# Altium footprint library 3.Inductors&Transformers.PcbLib: 51 footprints (part 3 of 4)
Each footprint in its own frame and in the unit in brackets; x right, y up, seen from the top. Pads: shape width x height; smd on the part's side, far side on the other; paste and mask are expansions set on the pad; w line width, h text height; cw(c..) or ccw(c..) is an arc to the next point about the centre after c.
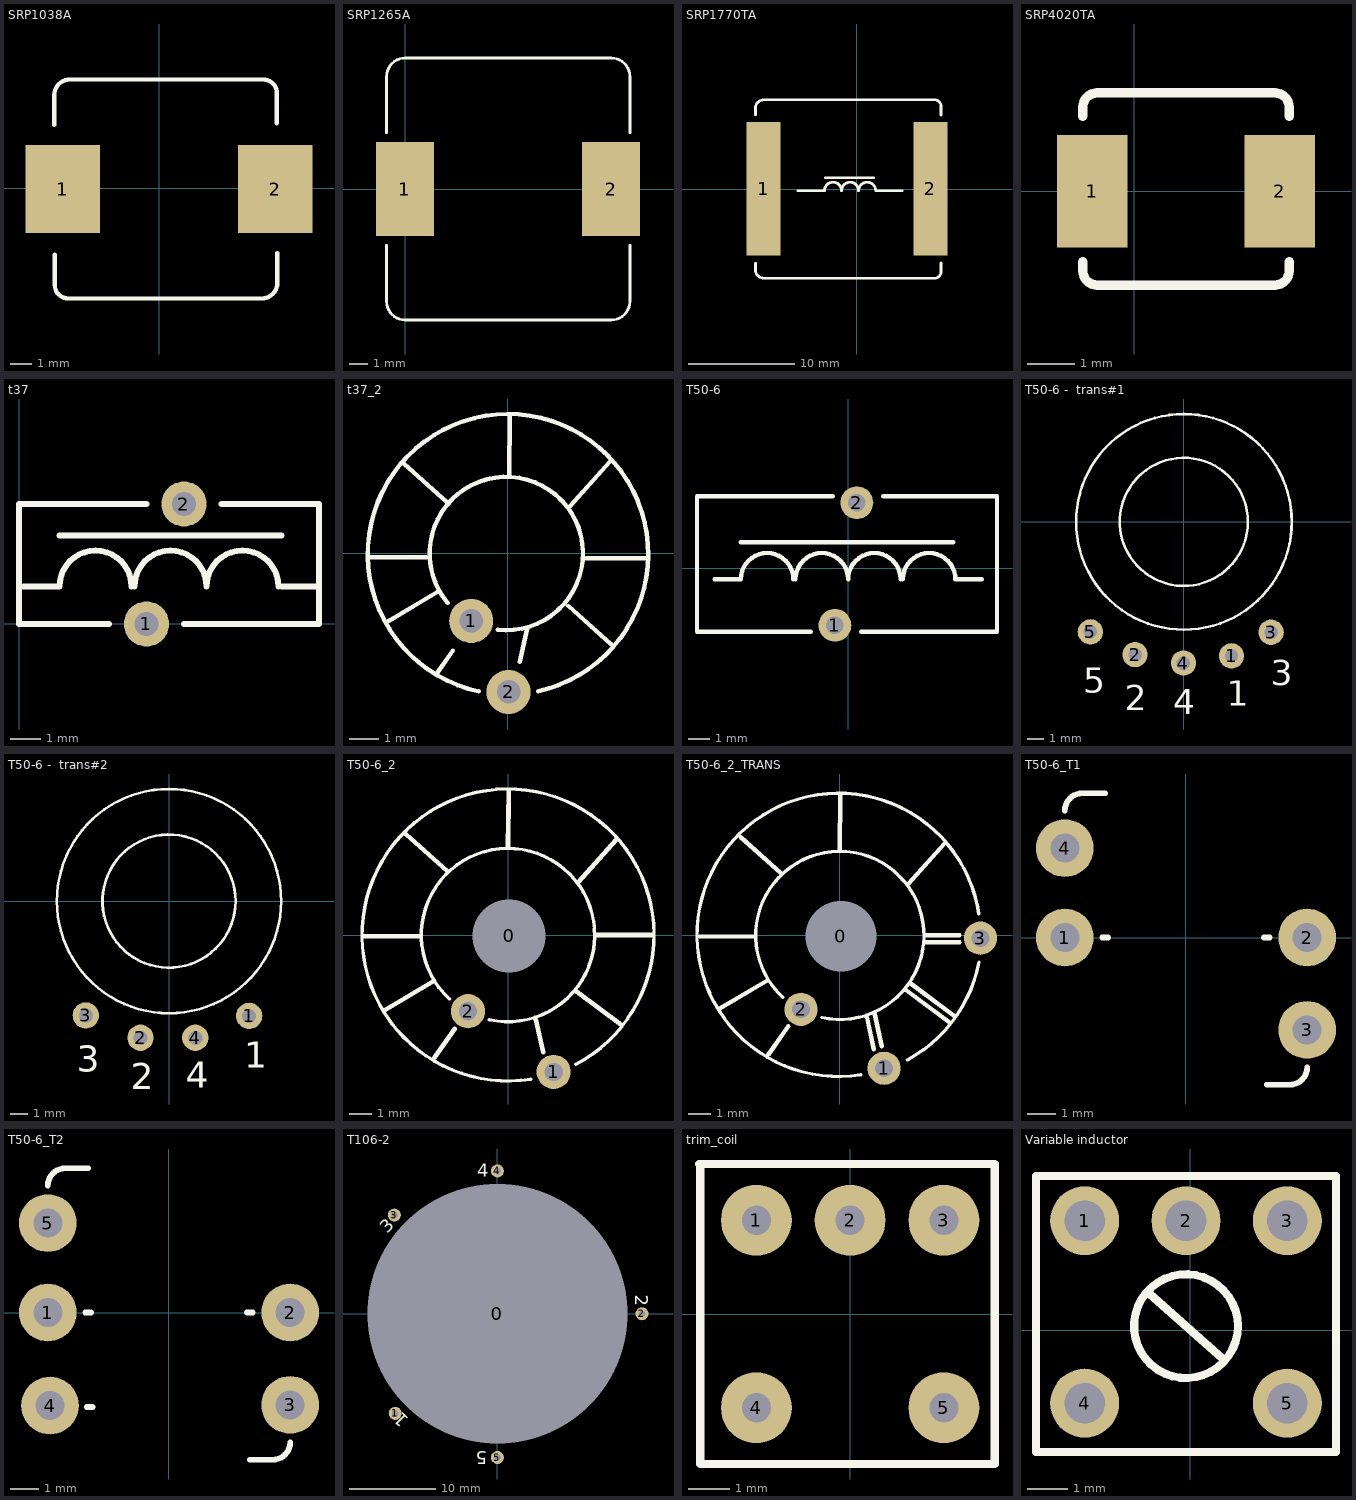
[diagram p2: the footprints below, top view; thin cyan lines are the x and y axes]

## SRP1038A [mm]
pads (2):
  rect 3.5x4.1 smd: 1(-4.525,-0.025) 2(5.425,-0.025)
Top Overlay:
  lines w0.2: -4.925,2.975 -4.925,4.35 ; -4.925,4.25 -4.925,4.375 cw(c-4.2,4.375) -4.2,5.1 ; -4.9,-4.525 ccw(c-4.275,-4.525) -4.275,-5.15 4.75,-5.15 ; -4.9,-4.475 -4.9,-3.1 ; -4.15,5.1 4.875,5.1 cw(c4.875,4.475) 5.5,4.475 ; 4.8,-5.15 ccw(c4.8,-4.425) 5.525,-4.425 5.525,-4.3 ; 5.5,3.05 5.5,4.425 ; 5.525,-4.4 5.525,-3.025
3D body "User Library-SRP 1038A.step": height 4, standoff 0, extent -4.925,-4.925 5.475,5.075

## SRP1265A [mm]
pads (2):
  rect 3.1x5 smd: 1(-0.025,0) 2(11,0)
Top Overlay:
  lines w0.15: -1,-3 -1,-6 ccw(c0,-6) 0,-7 11,-7 ccw(c11,-6) 12,-6 12,-3 ; -1,3 -1,6 cw(c0,6) 0,7 11,7 cw(c11,6) 12,6 12,3
3D body: height 6.2, standoff 0.2, extent -1,-7 12,7
3D body: height 2, standoff 0, extent 12,-2.5 12.25,2.5
3D body: height 2, standoff 0, extent -1.25,-2.5 -1,2.5

## SRP1770TA [mm]
pads (2):
  rect 3.2x12.5 smd: 1(-8.725,0.05) 2(6.9,0.05)
Top Overlay:
  lines w0.254: -9.5,-6.925 -9.5,-7.526 ccw(c-8.701,-7.526) -8.701,-8.325 7.305,-8.325 ccw(c7.305,-7.73) 7.9,-7.73 7.9,-6.9 ; -9.5,7 -9.5,7.601 cw(c-8.701,7.601) -8.701,8.4 7.305,8.4 cw(c7.305,7.805) 7.9,7.805 7.9,6.975 ; -5.5,-0.125 -3.05,-0.125 ; -3.025,-0.125 cw(c-2.225,-0.125) -1.425,-0.125 cw(c-0.625,-0.125) 0.175,-0.125 cw(c0.975,-0.125) 1.775,-0.125 ; -2.95,1.1 1.6,1.1 ; 1.825,-0.125 4.275,-0.125
3D body "User Library-SRP1770TA.step": height 6.75, standoff 0.05, extent -9.5,-8.475 7.9,8.425

## SRP4020TA [mm]
pads (2):
  rect 1.5x2.4 smd: 1(-0.9,0) 2(3.1,0)
Top Overlay:
  lines w0.2: -1.1,-1.5 -1.1,-1.7 ccw(c-0.8,-1.7) -0.8,-2 3,-2 ccw(c3,-1.7) 3.3,-1.7 3.3,-1.5 ; -1.1,1.6 -1.1,1.8 cw(c-0.8,1.8) -0.8,2.1 3,2.1 cw(c3,1.8) 3.3,1.8 3.3,1.6
3D body "User Library-SRP-4020 Inductor.step": height 2, standoff 0.05, extent -1.05,-1.9 3.25,2.1

## t37 [mm]
pads (2):
  round 1.5 hole 0.8: 1(4.25,0) 2(5.5,4)
Top Overlay:
  lines w0.2: 0.15,1.25 1.35,1.25 cw(c2.55,1.25) 3.75,1.25 ; 1.35,2.95 8.75,2.95 ; 3,0 0,0 0,4 4.25,4 ; 3.85,1.25 cw(c5.05,1.25) 6.25,1.25 cw(c7.45,1.25) 8.65,1.25 ; 5.5,0 10,0 10,4 6.75,4 ; 8.75,1.25 9.95,1.25
3D body "T37-6 IND.STEP": height 10.72, standoff 0, extent -0.25,-2.237 10.259,6.237

## t37_2 [mm]
pads (2):
  round 1.5 hole 0.8: 1(-1.238,-2.295) 2(0.032,-4.708)
Top Overlay:
  lines w0.15: -4.667,-0.136 -2.762,-0.136 ; -4.032,-2.295 -2.367,-1.303 ; -3.522,3.038 -2.068,1.744 ; -2.419,-4.095 -1.862,-3.306 ; -2.033,-1.688 cw(c-0.045,-0.005) -0.34,-2.593 ; -0.98,-4.691 cw(c0.013,-0.03) 1.042,-4.683 ; 0.059,2.658 0.078,4.669 ; 0.413,-3.692 0.667,-2.549 ; 2.066,-1.788 3.52,-3.082 ; 2.106,1.591 3.479,3.124 ; 2.675,-0.165 4.731,-0.165
3D body "T37-6 IND.STEP": height 6.34, standoff -2.14, extent -5.161,-5.3 5.348,5.417

## T50-6 [mm]
pads (2):
  round 1.5 hole 0.8: 1(-0.6,-2.6) 2(0.4,3)
Top Overlay:
  lines w0.2: -6.1,-0.5 -4.9,-0.5 cw(c-3.7,-0.5) -2.5,-0.5 ; -4.9,1.2 4.8,1.2 ; -2.4,-0.5 cw(c-1.2,-0.5) 0,-0.5 cw(c1.2,-0.5) 2.4,-0.5 ; -1.7,-2.9 -6.9,-2.9 -6.9,3.3 -0.7,3.3 ; 0.6,-2.9 6.8,-2.9 6.8,3.3 1.6,3.3 ; 2.5,-0.5 cw(c3.7,-0.5) 4.9,-0.5 6.1,-0.5
3D body "User Library-Amidon T50-6.step": height 15.97, standoff -3.68, extent -9.873,-2.93 9.473,3.3

## T50-6 -  trans#1 [mm]
pads (5):
  round 1.5 hole 0.8: 1(2.825,-7.95) 2(-2.9,-7.875) 3(5.175,-6.55) 4(-0.025,-8.375) 5(-5.55,-6.525)
Top Overlay:
  circle w0.15: c0,0 r6.4
  circle w0.15: c0,0 r3.8
  text "4" at -0.625,-11.4 h1.5
  text "3" at 5.15,-9.7 h1.5
  text "5" at -5.975,-10.15 h1.5
  text "2" at -3.5,-11.175 h1.5
  text "1" at 2.55,-10.925 h1.5
3D body "t50-6.STEP": height 5.83, standoff 1, extent -6.35,-6.375 6.25,6.225

## T50-6 -  trans#2 [mm]
pads (4):
  round 1.5 hole 0.8: 1(4.575,-6.55) 2(-1.625,-7.8) 3(-4.75,-6.525) 4(1.5,-7.8)
Top Overlay:
  circle w0.15: c0,0 r3.8
  circle w0.15: c0,0 r6.4
  text "1" at 4.3,-9.525 h1.5
  text "2" at -2.175,-10.725 h1.5
  text "3" at -5.275,-9.75 h1.5
  text "4" at 0.95,-10.65 h1.5
3D body "t50-6.STEP": height 5.83, standoff 1, extent -6.375,-6.275 6.225,6.325

## T50-6_2 [mm]
pads (3):
  round 1.5 hole 3.2: 0(0.051,-0.038)
  round 1.5 hole 0.8: 1(2,-6) 2(-1.751,-3.338)
Top Overlay:
  lines w0.15: -2.562,-2.807 cw(c0,0) -0.815,-3.712 ; 0.995,-6.322 cw(c0,0) 2.965,-5.672
  lines w0.2: -6.324,-0.05 -3.85,-0.05 ; -5.416,-3.308 -3.261,-2.024 ; -4.475,4.425 -2.65,2.8 ; -3.225,-5.375 -2.325,-4.1 ; 0,3.825 0.025,6.35 ; 1.225,-3.7 1.536,-5.136 ; 3,-2.475 4.975,-3.95 ; 3.081,2.312 4.75,4.175 ; 3.851,0 6.373,0
3D body "t50-6.STEP": height 5.83, standoff 1, extent -6.35,-6.375 6.25,6.225

## T50-6_2_TRANS [mm]
pads (4):
  round 1.5 hole 3.2: 0(0.051,-0.038)
  round 1.5 hole 0.8: 1(2,-6) 2(-1.751,-3.338) 3(6.35,-0.125)
Top Overlay:
  lines w0.15: -2.562,-2.807 cw(c0,0) -0.815,-3.712 ; 0.945,-6.297 cw(c-0.05,0.025) 6.281,0.963 ; 3.051,-5.626 ccw(c0,0) 6.287,-1.198
  lines w0.2: -6.324,-0.05 -3.85,-0.05 ; -5.416,-3.308 -3.261,-2.024 ; -4.475,4.425 -2.65,2.8 ; -3.225,-5.375 -2.325,-4.1 ; 0,3.825 0.025,6.35 ; 1.225,-3.7 1.536,-5.136 ; 1.579,-3.563 1.89,-4.999 ; 3,-2.475 4.975,-3.95 ; 3.081,2.312 4.75,4.175 ; 3.175,-2.15 5.15,-3.625 ; 3.851,-0.3 5.406,-0.3 ; 3.851,0 5.406,0
3D body "t50-6.STEP": height 5.83, standoff 1, extent -6.35,-6.375 6.25,6.225

## T50-6_T1 [mm]
pads (4):
  round 2 hole 1: 1(-4.2,0) 2(4.2,0) 3(4.2,-3.2) 4(-4.2,3.1)
Top Overlay:
  lines w0.2: -4.2,4.4 cw(c-3.6,4.4) -3.6,5 -2.8,5 ; -2.9,0 -2.7,0 ; 2.7,0 2.9,0 ; 2.8,-5.1 3.6,-5.1 ccw(c3.6,-4.5) 4.2,-4.5
3D body "t50-6.STEP": height 10.3, standoff -2.3, extent -2.43,-5.9 2.4,6.7

## T50-6_T2 [mm]
pads (5):
  round 2 hole 1: 1(-4.2,0) 2(4.2,0) 3(4.2,-3.2) 4(-4.125,-3.225) 5(-4.2,3.1)
Top Overlay:
  lines w0.2: -4.2,4.4 cw(c-3.6,4.4) -3.6,5 -2.8,5 ; -2.9,0 -2.7,0 ; -2.85,-3.275 -2.65,-3.275 ; 2.7,0 2.9,0 ; 2.8,-5.1 3.6,-5.1 ccw(c3.6,-4.5) 4.2,-4.5
3D body "t50-6.STEP": height 10.3, standoff -2.3, extent -2.43,-5.9 2.4,6.7

## T106-2 [mm]
pads (6):
  round 4 hole 30: 0(0,0)
  round 1.5 hole 0.8: 1(-11.8,-11.5) 2(16.7,0) 3(-11.9,11.4) 4(0,16.5) 5(0,-16.6)
Top Overlay:
  text "5" at -1.2,-15.9 h1.5
  text "4" at -2.3,15.8 h1.5
  text "3" at -12.7,9.2 h1.5
  text "1" at -10.1,-12.2 h1.5
  text "2" at 15.9,2.2 h1.5
3D body "T106-2.STEP": height 8.1, standoff -3, extent -13.55,-13.5 13.35,13.4

## trim_coil [mm]
pads (5):
  round 1.7 hole 0.7: 1(-2.25,2.25) 2(0,2.25) 3(2.25,2.25) 4(-2.25,-2.25) 5(2.25,-2.25)
Top Overlay:
  lines w0.2: -3.625,3.6 3.475,3.6 3.475,-3.6 -3.6,-3.6 -3.6,3.6 -3.625,3.6
3D body "trim_coil.STEP": height 12.5, standoff -3, extent -3.6,-3.6 3.5,3.6

## Variable inductor [mm]
pads (5):
  round 1.7 hole 1: 1(-2.6,2.7) 2(-0.1,2.7) 3(2.4,2.7) 4(-2.6,-1.8) 5(2.4,-1.8)
Top Overlay:
  circle w0.2: c-0.1,0.1 r1.281
  lines w0.2: -1,0.9 0.8,-0.7 ; -3.8,-3 3.6,-3 3.6,3.8 -3.8,3.8 -3.8,-3